# Altium footprint library Pcblib.PcbLib: 281 footprints (part 5 of 18)
Each footprint in its own frame and in the unit in brackets; x right, y up, seen from the top. Pads: shape width x height; smd on the part's side, far side on the other; paste and mask are expansions set on the pad; w line width, h text height; cw(c..) or ccw(c..) is an arc to the next point about the centre after c.
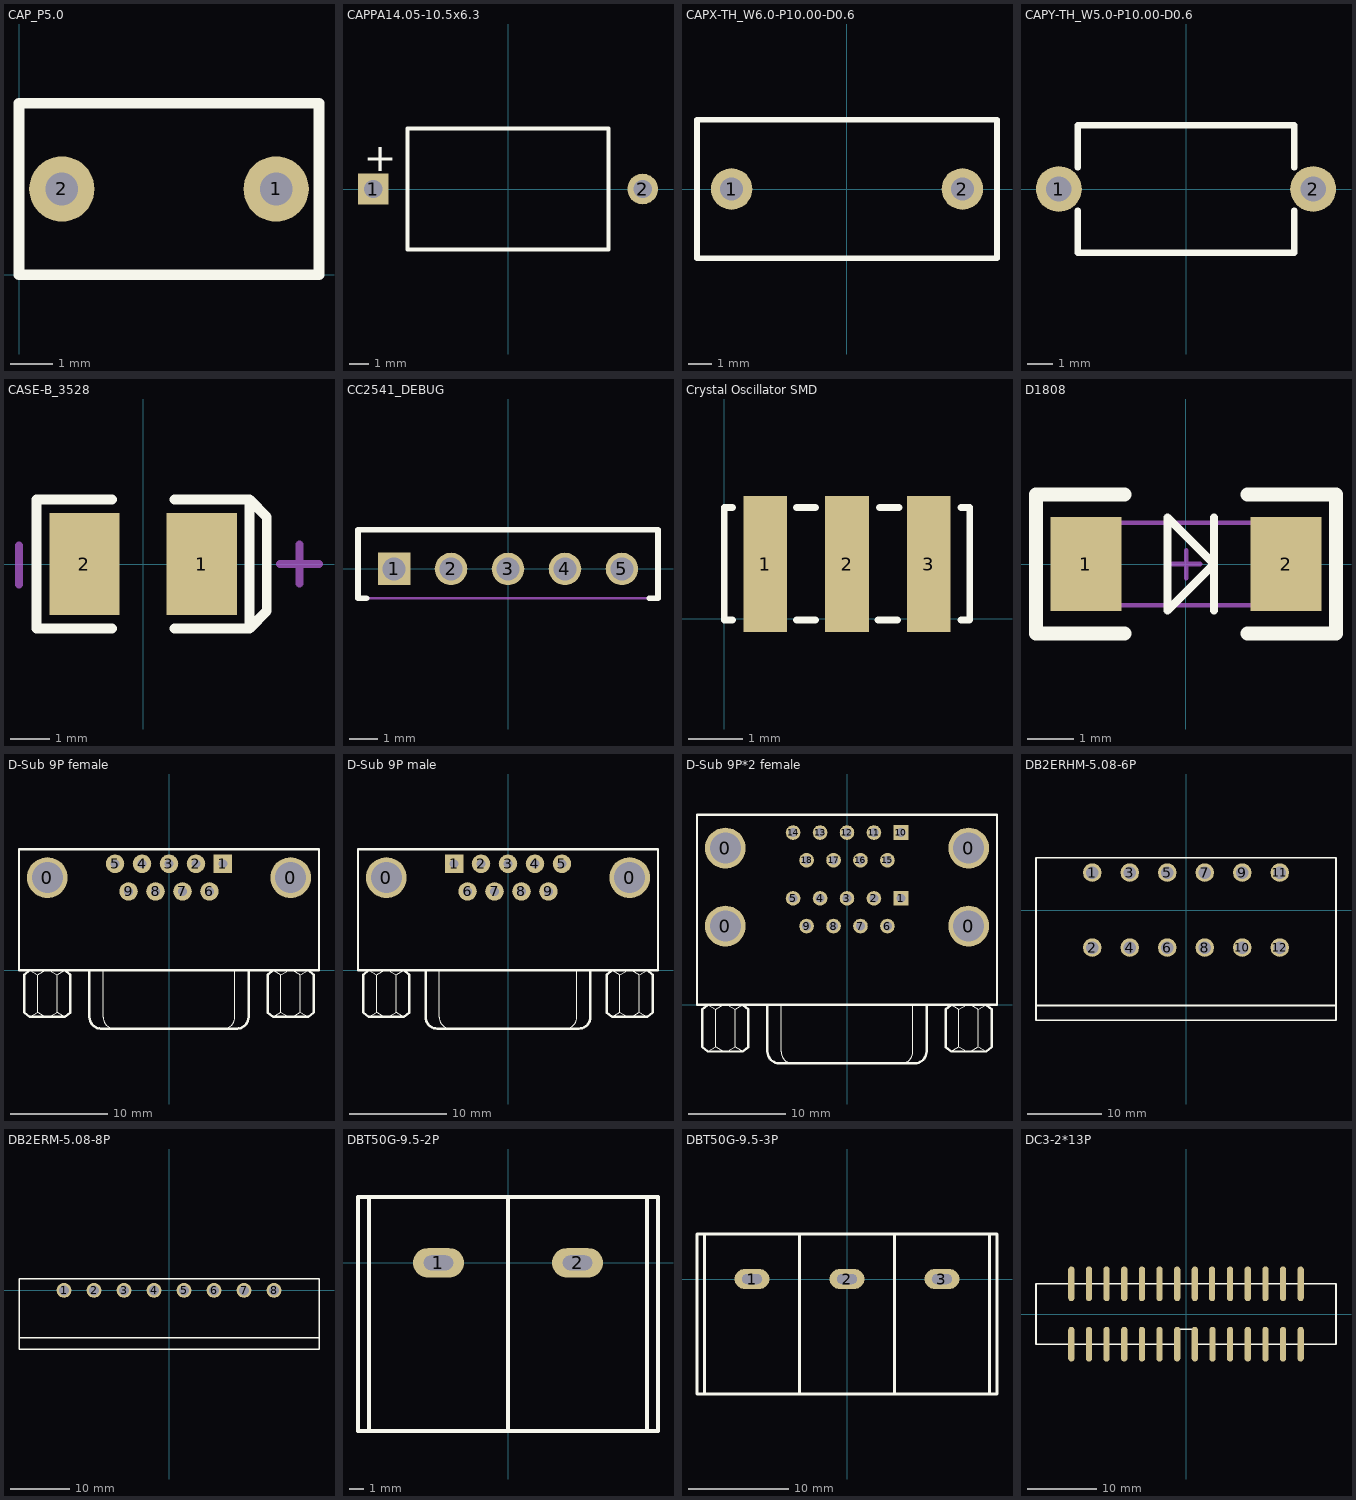
[diagram p4: the footprints below, top view; thin cyan lines are the x and y axes]

## CAP_P5.0 [mil]
pads (2):
  round 60 hole 30: 1(236.22,78.74) 2(39.37,78.74)
Top Overlay:
  lines w10: 0,0 0,157.48 275.59,157.48 275.59,0 0,0

## CAPPA14.05-10.5x6.3 [mm] "Capacitor, Axial, Polarised; Body 10.5 x 6.3 mm (LxDia. max), Lead Dia. 0.6 mm (typ)"
height 5.08
pads (2):
  rect 1.6x1.6 hole 0.95: 1(-7.025,0)
  round 1.6 hole 0.95: 2(7.025,0)
Top Overlay:
  lines w0.2: -5.25,-3.15 -5.25,3.15 5.25,3.15 5.25,-3.15 -5.25,-3.15
  text "+" at -7.525,0.925 h1.5

## CAPX-TH_W6.0-P10.00-D0.6 [mm]
pads (2):
  round 1.8 hole 1: 1(-5,0) 2(5,0)
Top Overlay:
  lines w0.254: -6.5,-3 6.5,-3 6.5,3 -6.5,3 -6.5,-3

## CAPY-TH_W5.0-P10.00-D0.6 [mm]
pads (2):
  round 1.8 hole 1: 1(-5,0) 2(5,0)
Top Overlay:
  lines w0.254: -4.25,-0.846 -4.25,-2.499 4.25,-2.499 4.25,-0.846 ; -4.25,0.846 -4.25,2.499 4.25,2.499 4.25,0.846

## CASE-B_3528 [mm]
pads (2):
  rect 1.8x2.6 smd: 1(1.5,0) 2(-1.5,0)
Top Overlay:
  lines w0.254: -0.8,-1.65 -2.727,-1.65 -2.727,1.65 -0.8,1.65 ; 0.8,-1.65 2.727,-1.65 ; 0.8,1.65 2.727,1.65 ; 2.727,-1.65 2.727,1.65 ; 2.727,-1.65 3.163,-1.2 3.163,1.2 2.727,1.65
Mechanical 15:
  lines w0.203: -3.175,-0.525 -3.175,0.475 ; 3.5,0 4.5,0 ; 4,-0.5 4,0.5
3D body "User Library-AVX_BCASE.STEP": height 2.03, standoff 0, extent -1.85,-1.465 1.85,1.465

## CC2541_DEBUG [mil]
pads (5):
  rect 45x45 hole 32: 1(-157.48,0)
  round 45 hole 32: 2(-78.74,0) 3(0,0) 4(78.74,0) 5(157.48,0)
Top Overlay:
  lines w7.87: -195.48,-40.46 -207.29,-40.46 -207.29,54.02 -200.01,54.02 207.29,54.02 207.29,-40.46 195,-40.46
Mechanical 5:
  lines w3.94: -207.29,-40.46 207.29,-40.46 207.29,54.02 -207.29,54.02 -207.29,-40.46

## Crystal Oscillator SMD [mm]
pads (3):
  rect 0.8x2.5 smd: 1(0.75,1) 2(2.25,1) 3(3.75,1)
Top Overlay:
  lines w0.127: 0.152,-0.025 0,-0.025 0,2.032 0.152,2.032 ; 1.321,-0.025 1.676,-0.025 ; 1.321,2.032 1.676,2.032 ; 2.819,-0.025 3.175,-0.025 ; 2.845,2.032 3.2,2.032 ; 4.343,-0.025 4.496,-0.025 4.5,-0.021 4.5,2.032 4.343,2.032

## D1808 [mil]
height 43.31
pads (2):
  rect 60x80 smd: 1(-84.8,0) 2(84.8,0)
Top Overlay:
  lines w1: -15.59,39.37 -15.59,39.37 ; 23.78,0 23.78,0
  lines w7: 23.78,-39.37 23.78,39.37 ; -15.59,-39.37 23.78,0 -15.59,39.37 -15.59,-39.37
  lines w12: -52.18,-59.06 -127.18,-59.06 -127.18,59.06 -52.18,59.06 ; 52.18,-59.06 127.18,-59.06 127.18,59.06 52.18,59.06
Mechanical 13:
  lines w3.94: -85,-35 -85,35 ; 87.32,-35 87.32,35 ; -102.68,-35 105,-35 105,35 -102.68,35 -102.68,-35
Mechanical 15:
  lines w3.94: -11.43,0 12.2,0 ; 0.2,-12 0.2,11.62
3D body: height 43.31, standoff 0, extent 87.32,-40 105,40
3D body: height 43.31, standoff 0, extent -102.68,-40 -85,40
3D body: height 43.31, standoff 0, extent -85,-40 55,40
3D body: height 23.62, standoff 0, extent 55,-40 87.32,40

## D-Sub 9P female [mm]
pads (11):
  round 4.191 hole 3.175: 0(-12.495,9.5) 0(12.495,9.5)
  rect 1.905x1.905 hole 0.889: 1(5.54,10.92)
  round 1.905 hole 0.889: 2(2.77,10.92) 3(0,10.92) 4(-2.77,10.92) 5(-5.54,10.92) 6(4.155,8.08) 7(1.385,8.08) 8(-1.385,8.08) 9(-4.155,8.08)
Top Overlay:
  lines w0.127: -14.291,-4.8 -13.499,-4.325 ; -14.291,0 -13.499,-0.475 ; -12.707,-4.8 -13.499,-4.325 ; -12.707,0 -13.499,-0.475 ; -12.283,-4.8 -11.491,-4.325 ; -12.283,0 -11.491,-0.475 ; -10.699,-4.8 -11.491,-4.325 ; -10.699,0 -11.491,-0.475 ; -6.772,-4.824 ccw(c-5.596,-4.824) -5.596,-6 ; -6.772,-4.824 -6.772,0 ; 5.596,-6 ccw(c5.596,-4.824) 6.772,-4.824 ; 6.772,-4.824 6.772,0 ; 10.699,-4.8 11.491,-4.325 ; 10.699,0 11.491,-0.475 ; 12.283,-4.8 11.491,-4.325 ; 12.283,0 11.491,-0.475 ; 12.707,-4.8 13.499,-4.325 ; 12.707,0 13.499,-0.475 ; 14.291,-4.8 13.499,-4.325 ; 14.291,0 13.499,-0.475 ; -13.499,-4.325 -13.499,-0.475 ; -11.491,-4.325 -11.491,-0.475 ; 11.491,-4.325 11.491,-0.475 ; 13.499,-4.325 13.499,-0.475
  lines w0.254: -14.291,-4.8 -10.699,-4.8 ; -14.291,-4.8 -14.87,-4.325 -14.87,-0.475 -14.291,0 ; -10.699,-4.8 -10.12,-4.325 -10.12,-0.475 -10.699,0 ; -8.165,0 -8.165,-4.824 ccw(c-6.989,-4.824) -6.989,-6 6.989,-6 ccw(c6.989,-4.824) 8.165,-4.824 8.165,0 ; 10.699,-4.8 14.291,-4.8 ; 10.699,-4.8 10.12,-4.325 10.12,-0.475 10.699,0 ; 14.291,-4.8 14.87,-4.325 14.87,-0.475 14.291,0 ; -15.4,0 15.4,0 15.4,12.4 -15.4,12.4 -15.4,0

## D-Sub 9P male [mm]
pads (11):
  round 4.191 hole 3.175: 0(-12.495,9.5) 0(12.495,9.5)
  rect 1.905x1.905 hole 0.889: 1(-5.54,10.92)
  round 1.905 hole 0.889: 2(-2.77,10.92) 3(0,10.92) 4(2.77,10.92) 5(5.54,10.92) 6(-4.155,8.08) 7(-1.385,8.08) 8(1.385,8.08) 9(4.155,8.08)
Top Overlay:
  lines w0.127: -14.291,-4.8 -13.499,-4.325 ; -14.291,0 -13.499,-0.475 ; -12.707,-4.8 -13.499,-4.325 ; -12.707,0 -13.499,-0.475 ; -12.283,-4.8 -11.491,-4.325 ; -12.283,0 -11.491,-0.475 ; -10.699,-4.8 -11.491,-4.325 ; -10.699,0 -11.491,-0.475 ; -7.067,0 -7.067,-4.824 ccw(c-5.891,-4.824) -5.891,-6 ; 5.891,-6 ccw(c5.891,-4.824) 7.067,-4.824 7.067,0 ; 10.699,-4.8 11.491,-4.325 ; 10.699,0 11.491,-0.475 ; 12.283,-4.8 11.491,-4.325 ; 12.283,0 11.491,-0.475 ; 12.707,-4.8 13.499,-4.325 ; 12.707,0 13.499,-0.475 ; 14.291,-4.8 13.499,-4.325 ; 14.291,0 13.499,-0.475 ; -13.499,-4.325 -13.499,-0.475 ; -11.491,-4.325 -11.491,-0.475 ; 11.491,-4.325 11.491,-0.475 ; 13.499,-4.325 13.499,-0.475
  lines w0.254: -14.291,-4.8 -10.699,-4.8 ; -14.291,-4.8 -14.87,-4.325 -14.87,-0.475 -14.291,0 ; -10.699,-4.8 -10.12,-4.325 -10.12,-0.475 -10.699,0 ; -8.46,0 -8.46,-4.824 ccw(c-7.284,-4.824) -7.284,-6 7.284,-6 ccw(c7.284,-4.824) 8.46,-4.824 8.46,0 ; 10.699,-4.8 14.291,-4.8 ; 10.699,-4.8 10.12,-4.325 10.12,-0.475 10.699,0 ; 14.291,-4.8 14.87,-4.325 14.87,-0.475 14.291,0 ; -15.4,0 15.4,0 15.4,12.4 -15.4,12.4 -15.4,0

## D-Sub 9P*2 female [mm]
pads (22):
  round 4.191 hole 3.175: 0(-12.495,16.08) 0(-12.495,8.08) 0(12.495,16.08) 0(12.495,8.08)
  rect 1.5x1.5 hole 0.889: 1(5.54,10.92) 10(5.54,17.68)
  round 1.5 hole 0.889: 2(2.77,10.92) 3(0,10.92) 4(-2.77,10.92) 5(-5.54,10.92) 6(4.155,8.08) 7(1.385,8.08) 8(-1.385,8.08) 9(-4.155,8.08) 11(2.77,17.68) 12(0,17.68) 13(-2.77,17.68) 14(-5.54,17.68) 15(4.155,14.84) 16(1.385,14.84) 17(-1.385,14.84) 18(-4.155,14.84)
Top Overlay:
  lines w0.127: -14.291,-4.8 -13.499,-4.325 ; -14.291,0 -13.499,-0.475 ; -12.707,-4.8 -13.499,-4.325 ; -12.707,0 -13.499,-0.475 ; -12.283,-4.8 -11.491,-4.325 ; -12.283,0 -11.491,-0.475 ; -10.699,-4.8 -11.491,-4.325 ; -10.699,0 -11.491,-0.475 ; -6.772,-4.824 ccw(c-5.596,-4.824) -5.596,-6 ; -6.772,-4.824 -6.772,0 ; 5.596,-6 ccw(c5.596,-4.824) 6.772,-4.824 ; 6.772,-4.824 6.772,0 ; 10.699,-4.8 11.491,-4.325 ; 10.699,0 11.491,-0.475 ; 12.283,-4.8 11.491,-4.325 ; 12.283,0 11.491,-0.475 ; 12.707,-4.8 13.499,-4.325 ; 12.707,0 13.499,-0.475 ; 14.291,-4.8 13.499,-4.325 ; 14.291,0 13.499,-0.475 ; -13.499,-4.325 -13.499,-0.475 ; -11.491,-4.325 -11.491,-0.475 ; 11.491,-4.325 11.491,-0.475 ; 13.499,-4.325 13.499,-0.475
  lines w0.254: -14.291,-4.8 -10.699,-4.8 ; -14.291,-4.8 -14.87,-4.325 -14.87,-0.475 -14.291,0 ; -10.699,-4.8 -10.12,-4.325 -10.12,-0.475 -10.699,0 ; -8.165,0 -8.165,-4.824 ccw(c-6.989,-4.824) -6.989,-6 6.989,-6 ccw(c6.989,-4.824) 8.165,-4.824 8.165,0 ; 10.699,-4.8 14.291,-4.8 ; 10.699,-4.8 10.12,-4.325 10.12,-0.475 10.699,0 ; 14.291,-4.8 14.87,-4.325 14.87,-0.475 14.291,0 ; -15.4,0 -15.4,19.5 15.4,19.5 15.4,0 -15.4,0

## DB2ERHM-5.08-6P [mm]
pads (12):
  round 2.5 hole 1.7: 1(-12.7,5.08) 2(-12.7,-5.08) 3(-7.62,5.08) 4(-7.62,-5.08) 5(-2.54,5.08) 6(-2.54,-5.08) 7(2.54,5.08) 8(2.54,-5.08) 9(7.62,5.08) 10(7.62,-5.08) 11(12.7,5.08) 12(12.7,-5.08)
Top Overlay:
  lines w0.254: -20.32,-12.92 20.32,-12.92 ; -20.32,-14.92 -20.32,7.08 20.32,7.08 20.32,-14.92 -20.32,-14.92

## DB2ERM-5.08-8P [mm]
pads (8):
  round 2.5 hole 1.7: 1(-17.78,0) 2(-12.7,0) 3(-7.62,0) 4(-2.54,0) 5(2.54,0) 6(7.62,0) 7(12.7,0) 8(17.78,0)
Top Overlay:
  lines w0.254: -25.4,-8 25.4,-8 ; -25.4,-10 25.4,-10 25.4,2 -25.4,2 -25.4,-10

## DBT50G-9.5-2P [mm]
pads (2):
  oval 3.5x2 hole 1 slot 2 at 0 deg: 1(-4.75,0) 2(4.75,0)
Top Overlay:
  lines w0.254: -9.5,-11.5 -9.5,4.5 ; 0,-11.5 0,4.5 ; 9.5,-11.5 9.5,4.5 ; -10.25,-11.5 10.25,-11.5 10.25,4.5 -10.25,4.5 -10.25,-11.5

## DBT50G-9.5-3P [mm]
pads (3):
  oval 3.5x2 hole 1 slot 2 at 0 deg: 1(-9.5,0) 2(0,0) 3(9.5,0)
Top Overlay:
  lines w0.254: -14.25,-11.5 -14.25,4.5 ; -4.75,-11.5 -4.75,4.5 ; 4.75,-11.5 4.75,4.5 ; 14.25,-11.5 14.25,4.5 ; -15,-11.5 15,-11.5 15,4.5 -15,4.5 -15,-11.5

## DC3-2*13P [mm]
pads (28):
  oval 0.9x5 smd: 1(-16.51,-4.35) 2(-16.51,4.35) 3(-13.97,-4.35) 4(-13.97,4.35) 5(-11.43,-4.35) 6(-11.43,4.35) 7(-8.89,-4.35) 8(-8.89,4.35) 9(-6.35,-4.35) 10(-6.35,4.35) 11(-3.81,-4.35) 12(-3.81,4.35) 13(-1.27,-4.35) 14(-1.27,4.35) 15(1.27,-4.35) 16(1.27,4.35) 17(3.81,-4.35) 18(3.759,4.35) 19(6.35,-4.35) 20(6.35,4.35) 21(8.89,-4.35) 22(8.89,4.35) 23(11.43,-4.35) 24(11.43,4.35) 25(13.97,-4.35) 26(13.97,4.35) 27(16.51,-4.35) 28(16.51,4.35)
Top Overlay:
  lines w0.254: -21.59,-4.35 -21.59,4.35 21.59,4.35 21.59,-4.35 1.27,-4.35 1.27,-2.21 -1.27,-2.21 -1.27,-4.35 -21.59,-4.35